# Altium footprint library NDLib.PCBLIB: 499 footprints (part 12 of 32)
Each footprint in its own frame and in the unit in brackets; x right, y up, seen from the top. Pads: shape width x height; smd on the part's side, far side on the other; paste and mask are expansions set on the pad; w line width, h text height; cw(c..) or ccw(c..) is an arc to the next point about the centre after c.
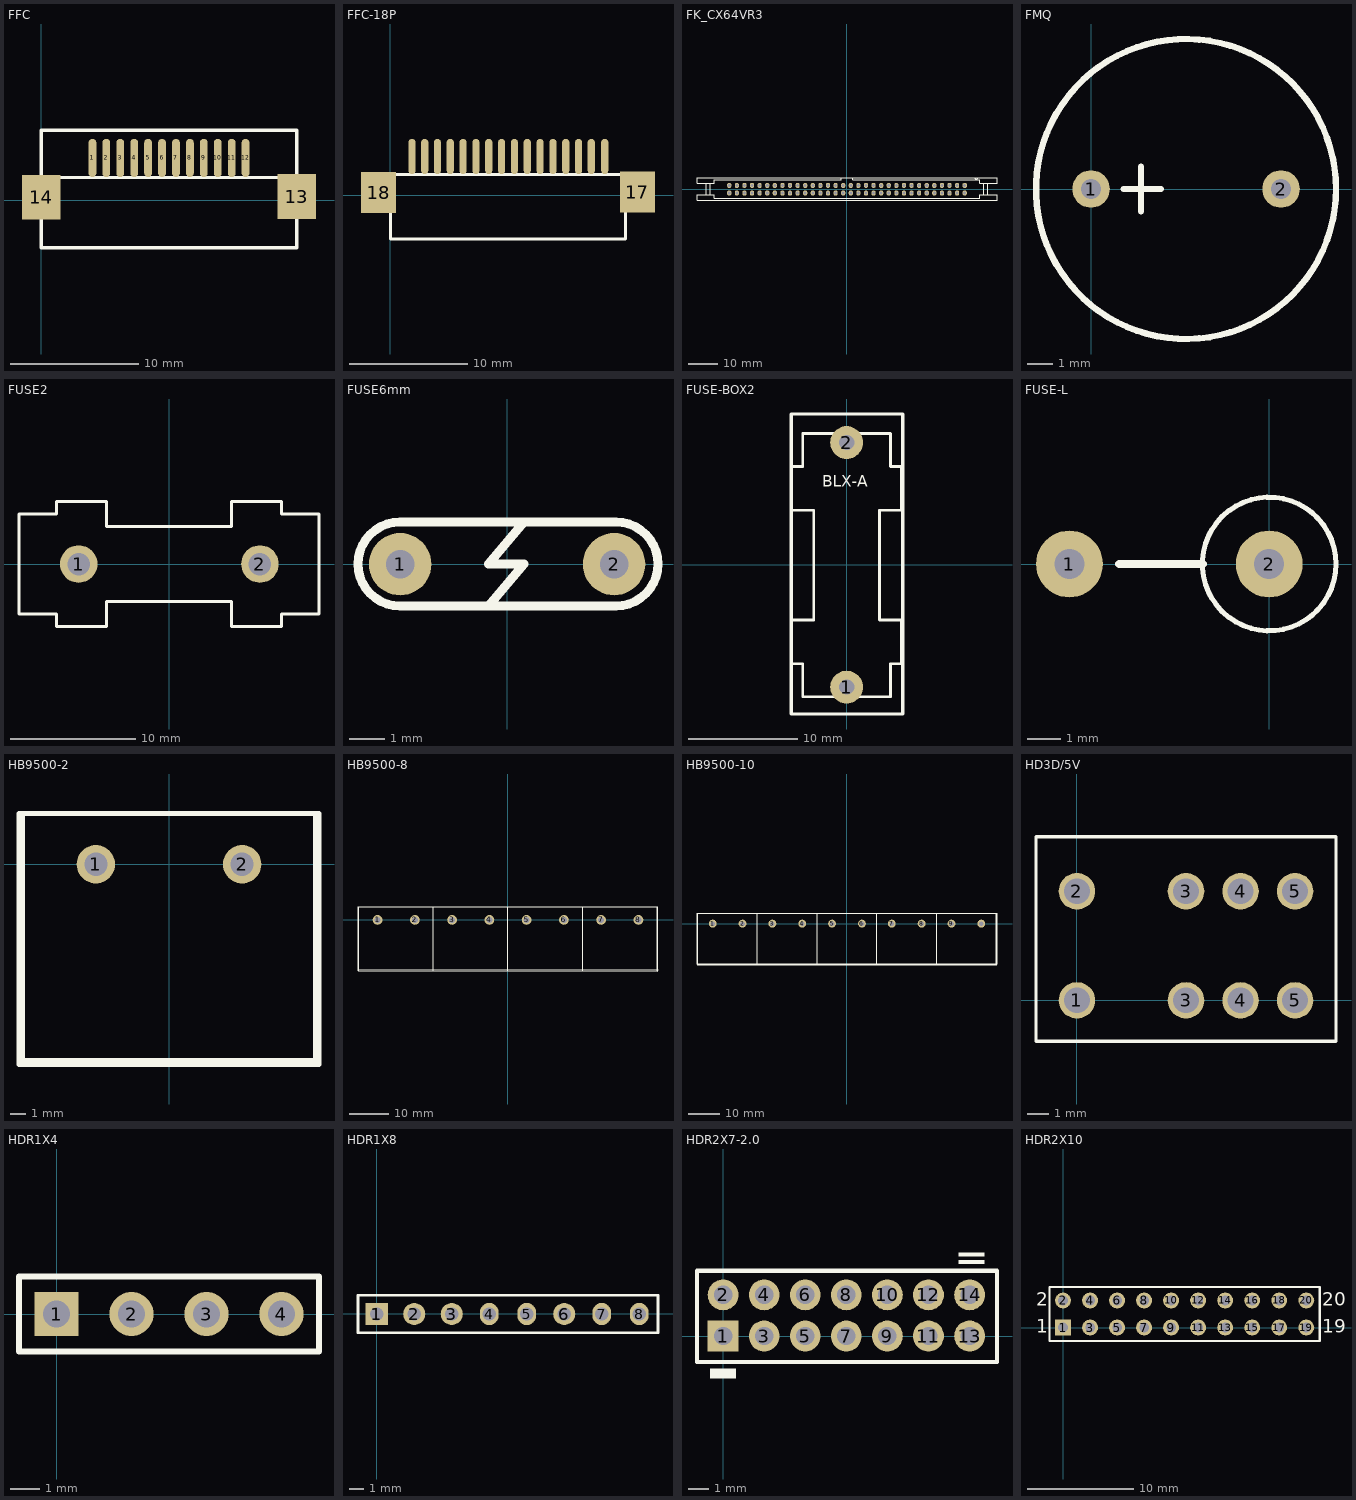
[diagram p11: the footprints below, top view; thin cyan lines are the x and y axes]

## FFC [mil] "12P排线插座"
pads (14):
  oval 24x118.11 smd: 1(157.48,130) 2(200.43,130) 3(243.38,130) 4(286.33,130) 5(329.28,130) 6(372.23,130) 7(415.17,130) 8(458.12,130) 9(501.07,130) 10(544.02,130) 11(586.97,130) 12(629.92,130)
  rect 118.11x137.8 smd: 13(787.4,11) 14(0,9)
TopOverlay:
  lines w10: 0,69.83 787.4,69.83 ; 0,-146.7 0,215 787.4,215 787.4,-146.7 0,-146.7

## FFC-18P [mil] "18P_FFC"
pads (18):
  oval 24x118.11 smd: 1(72.48,130) 2(115,130) 3(157.48,130) 4(200.43,130) 5(243.38,130) 6(286.33,130) 7(329.28,130) 8(372.23,130) 9(415.17,130) 10(458.12,130) 11(501.07,130) 12(544.02,130) 13(586.97,130) 14(629.92,130) 15(672.48,130) 16(717.48,130)
  rect 118.11x137.8 smd: 17(826.77,11) 18(-39.37,9)
TopOverlay:
  lines w10: 0,-146.7 0,69.83 787.4,69.83 787.4,-146.7 0,-146.7

## FK_CX64VR3 [mil]
height 500
pads (64):
  oct 55x70 hole 40: 1(1550,50)
  oval 55x70 hole 40: 2(1550,-50) 3(1450,50) 4(1450,-50) 5(1350,50) 6(1350,-50) 7(1250,50) 8(1250,-50) 9(1150,50) 10(1150,-50) 11(1050,50) 12(1050,-50) 13(950,50) 14(950,-50) 15(850,50) 16(850,-50) 17(750,50) 18(750,-50) 19(650,50) 20(650,-50) 21(550,50) 22(550,-50) 23(450,50) 24(450,-50) 25(350,50) 26(350,-50) 27(250,50) 28(250,-50) 29(150,50) 30(150,-50) 31(50,50) 32(50,-50) 33(-50,50) 34(-50,-50) 35(-150,50) 36(-150,-50) 37(-250,50) 38(-250,-50) 39(-350,50) 40(-350,-50) 41(-450,-50) 42(-450,50) 43(-550,-50) 44(-550,50) 45(-650,-50) 46(-650,50) 47(-750,-50) 48(-750,50) 49(-850,-50) 50(-850,50) 51(-950,-50) 52(-950,50) 53(-1050,-50) 54(-1050,50) 55(-1150,-50) 56(-1150,50) 57(-1250,-50) 58(-1250,50) 59(-1350,-50) 60(-1350,50) 61(-1450,-50) 62(-1450,50) 63(-1550,-50) 64(-1550,50)
TopOverlay:
  lines w6: -1849.82,-71.9 -1849.82,78.1 ; -1799.82,-71.9 -1799.82,78.1 ; -74.82,153.1 -74.82,128.1 -1749.82,128.1 -1749.82,78.1 -1974.82,78.1 -1974.82,153.1 1975.18,153.1 1975.18,78.1 1750.18,78.1 1750.18,128.1 75.18,128.1 75.18,153.1 ; 1676.87,152.59 1701.87,127.59 1726.87,152.59 ; 1800.18,-71.9 1800.18,78.1 ; 1850.18,-71.9 1850.18,78.1 ; -1974.82,-146.9 -1974.82,-71.9 -1749.82,-71.9 -1749.82,-121.9 1750.18,-121.9 1750.18,-71.9 1975.18,-71.9 1975.18,-146.9 -1974.82,-146.9

## FMQ [mm]
pads (2):
  round 1.5 hole 0.8: 1(0,0) 2(7.6,0)
TopOverlay:
  circle w0.254: c3.799,0 r6.001
  lines w0.254: 1.3,0 2.8,0 ; 2,-0.9 2,0.9
3D body: height 9.65, standoff -4.5, extent -5.727,-6 9.727,6

## FUSE2 [mm]
pads (2):
  round 3 hole 1.8: 1(-7.25,0) 2(7.25,0)
TopOverlay:
  lines w0.254: -11.675,-4 -12.025,-4 ; -11,-4 -9.35,-4 ; -12.025,-4 -12.025,-3.975 -12.025,4 -9.025,4 -9.025,5 -5.025,5 -5.025,3 4.975,3 4.975,5 8.975,5 8.975,4 11.975,4 11.975,-4 8.975,-4 8.975,-5 4.975,-5 4.975,-3 -5.025,-3 -5.025,-5 -9.025,-5 -9.025,-4 -12.025,-4

## FUSE6mm [mil]
pads (2):
  round 70 hole 32: 1(-120,0) 2(120,0)
TopOverlay:
  lines w10: -21,-47.06 19,0 -21,0 19,47.06 ; -120,-47.06 cw(c-120,0.19) -120,47.43 122,47.43 cw(c122,0.19) 122,-47.06 -120,-47.06

## FUSE-BOX2 [mm]
height 10
pads (2):
  round 3 hole 1.397: 1(0,-11.151) 2(0,11.151)
TopOverlay:
  lines w0.254: 4,-11.675 4,-12.025 ; 4,-11 4,-9.35 ; 4,-12.025 4,-9.025 5,-9.025 5,-5.025 3,-5.025 3,4.975 5,4.975 5,8.975 4,8.975 4,11.975 -4,11.975 -4,8.975 -5,8.975 -5,4.975 -3,4.975 -3,-5.025 -5,-5.025 -5,-9.025 -4,-9.025 -4,-12.025 3.975,-12.025 4,-12.025
  lines w0.305: -5.041,-13.606 -5.041,13.754 5.113,13.754 5.113,13.738 5.113,-13.606 -5.041,-13.606
  text "BLX-A" at -2.214,7.123 h1.02

## FUSE-L [mil]
height 511.81
pads (2):
  round 79 hole 35.43: 1(-236.22,0) 2(0,0)
TopOverlay:
  circle w6: c0,0 r79
  lines w10: -177.17,0 -78.74,0
3D body: height 545.04, standoff -77.66, extent -249.02,-74.21 77.68,83.27

## HB9500-2 [mm] "300V 25A"
height 15
pads (2):
  round 2.5 hole 1.5: 1(-4.75,0) 2(4.75,0)
TopOverlay:
  lines w0.3: -9.54,-12.731 9.638,-12.739 ; -9.5,-12.731 -9.5,3.3 ; 9.5,-12.65 9.5,3.3 ; -9.75,-13.016 9.75,-13.016 9.75,3.3 -9.75,3.3 -9.75,-13.016

## HB9500-8 [mm] "300V 25A"
height 15
pads (8):
  round 2.5 hole 1.5: 1(-33.25,0) 2(-23.75,0) 3(-14.25,0) 4(-4.75,0) 5(4.75,0) 6(14.25,0) 7(23.75,0) 8(33.25,0)
TopOverlay:
  lines w0.3: -38.04,-12.731 38.25,-12.764 ; -38,-13.016 -38,3.3 ; -19,-13.016 -19,3.3 ; 0,-13.016 0,3.3 ; 19,-13.016 19,3.3 ; 38,-13.016 38,3.3 ; 38.25,-13.049 -38.25,-13.016 -38.25,3.3 38.25,3.3 38.25,-13.016

## HB9500-10 [mm] "300V 25A"
height 15
pads (10):
  round 2.5 hole 1.5: 1(-42.75,0) 2(-33.25,0) 3(-23.75,0) 4(-14.25,0) 5(-4.75,0) 6(4.75,0) 7(14.25,0) 8(23.75,0) 9(33.25,0) 10(42.75,0)
TopOverlay:
  lines w0.3: -47.75,-13.016 47.742,-13.016 ; -47.75,-12.908 -47.75,3.3 47.5,3.3 47.5,-12.908 ; -47.54,-12.731 -28.5,-12.731 -28.5,3.3 ; -47.5,-12.908 -47.5,3.3 ; -38.04,-12.731 47.742,-12.731 ; -9.5,-12.908 -9.5,3.3 ; 9.5,-13.087 9.5,3.3 ; 28.5,-12.908 28.5,3.3 ; 47.75,-12.908 47.75,3.3

## HD3D/5V [mm]
height 10
pads (8):
  round 1.7 hole 1.2: 1(0,0) 2(0,5.08) 3(5.08,0) 3(5.08,5.08) 4(7.62,0) 4(7.62,5.08) 5(10.16,0) 5(10.16,5.08)
TopOverlay:
  lines w0.152: -1.905,-1.905 -1.905,7.62 12.065,7.62 12.065,-1.905 -1.905,-1.905

## HDR1X4 [mm] "Connector; Header; 4 Position"
height 3.099
pads (4):
  rect 1.5x1.5 hole 0.9: 1(0,0)
  round 1.5 hole 0.9: 2(2.54,0) 3(5.08,0) 4(7.62,0)
TopOverlay:
  lines w0.2: -1.27,-1.27 8.89,-1.27 8.89,1.27 -1.27,1.27 -1.27,-1.27

## HDR1X8 [mm] "Connector; Header; 8 Position"
pads (8):
  rect 1.5x1.5 hole 0.9: 1(0,0)
  round 1.5 hole 0.9: 2(2.54,0) 3(5.08,0) 6(12.7,0)
  oval 1.27x1.5 hole 0.9: 4(7.62,0) 5(10.16,0) 7(15.24,0) 8(17.78,0)
TopOverlay:
  lines w0.2: -1.27,-1.27 -1.27,1.27 19.05,1.27 19.05,-1.27 -1.27,-1.27
3D body: height 0.7, standoff -10.9, extent -1.27,-1.27 19.05,1.27

## HDR2X7-2.0 [mm] "Connector; Header; 7x2 Position"
height 8
pads (14):
  rect 1.5x1.5 hole 0.9: 1(0,0)
  round 1.5 hole 0.9: 2(0,2) 3(2,0) 4(2,2) 5(4,0) 6(4,2) 7(6,0) 8(6,2) 9(8,0) 10(8,2) 11(10,0) 12(10,2) 13(12,0) 14(12,2)
TopOverlay:
  region: 12.725,3.875 12.725,4.075 11.455,4.075 11.455,3.875
  region: 12.725,3.5 12.725,3.7 11.455,3.7 11.455,3.5
  region: 0.625,-2.075 0.625,-1.59 -0.645,-1.59 -0.645,-2.075
  lines w0.2: -1.27,-1.27 -1.27,3.175 13.335,3.175 13.335,-1.27 -1.27,-1.27

## HDR2X10 [mm] "Connector; Header; 10x2 Position"
height 3.099
pads (20):
  rect 1.5x1.5 hole 0.9: 1(0,0)
  round 1.5 hole 0.9: 2(0,2.54) 3(2.54,0) 4(2.54,2.54) 5(5.08,0) 6(5.08,2.54) 7(7.62,0) 8(7.62,2.54) 9(10.16,0) 10(10.16,2.54) 11(12.7,0) 12(12.7,2.54) 13(15.24,0) 14(15.24,2.54) 15(17.78,0) 16(17.78,2.54) 17(20.32,0) 18(20.32,2.54) 19(22.86,0) 20(22.86,2.54)
TopOverlay:
  lines w0.2: -1.27,-1.27 -1.27,3.81 0.635,3.81 24.13,3.81 24.13,-1.27 0.635,-1.27 -1.27,-1.27
  text "2" at -2.54,2.032 h1.27
  text "1" at -2.54,-0.508 h1.27
  text "19" at 24.384,-0.508 h1.27
  text "20" at 24.384,2.032 h1.27